# Altium footprint library UP-ROBOT Connectors(2013-02-26).PcbLib: 121 footprints (part 7 of 8)
Each footprint in its own frame and in the unit in brackets; x right, y up, seen from the top. Pads: shape width x height; smd on the part's side, far side on the other; paste and mask are expansions set on the pad; w line width, h text height; cw(c..) or ccw(c..) is an arc to the next point about the centre after c.
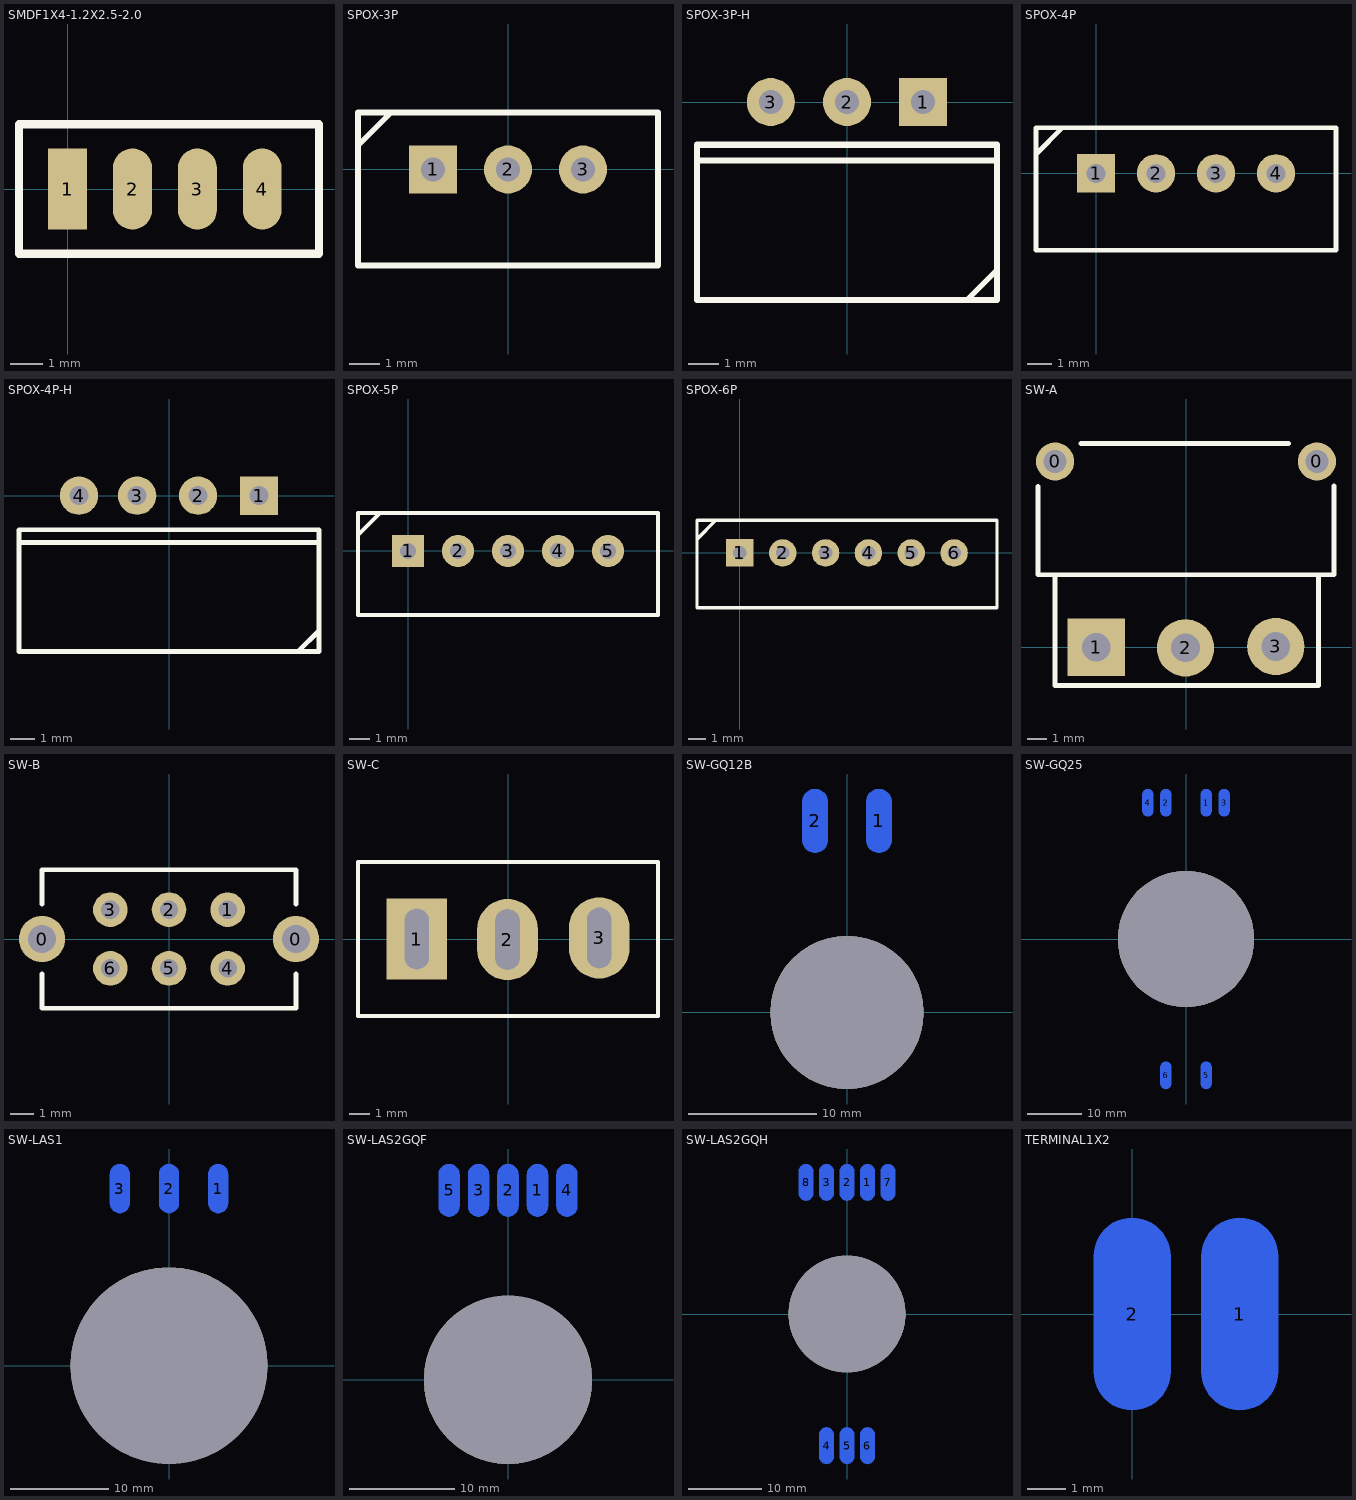
[diagram p6: the footprints below, top view; thin cyan lines are the x and y axes]

## SMDF1X4-1.2X2.5-2.0 [mm]
pads (4):
  rect 1.2x2.5 smd: 1(0,0)
  oval 1.2x2.5 smd: 2(2,0) 3(4,0) 4(6,0)
Top Overlay:
  lines w0.254: -1.5,-2 7.75,-2 7.75,2 -1.5,2 -1.5,0 -1.5,-2

## SPOX-3P [mm]
pads (3):
  rect 1.6x1.6 hole 0.8: 1(-2.5,0)
  round 1.6 hole 0.8: 2(0,0) 3(2.5,0)
Top Overlay:
  lines w0.203: -5,0.8 -3.9,1.9 ; -3.9,1.9 -3.9,1.9 ; -5,-3.2 5,-3.2 5,1.9 -5,1.9 -5,-3.2
3D body: height 5.9, standoff -3.5, extent -4.9,-3.1 5,1.8

## SPOX-3P-H [mm]
pads (3):
  rect 1.6x1.6 hole 0.8: 1(2.54,0)
  round 1.6 hole 0.8: 2(0,0) 3(-2.54,0)
Top Overlay:
  lines w0.203: -5,-1.95 5,-1.95 ; 4,-6.6 5,-5.6 ; -5,-6.6 -5,-1.425 5,-1.425 5,-6.6 -5,-6.6
3D body: height 4.9, standoff -3.5, extent -4.95,-6.65 4.95,1.25

## SPOX-4P [mm]
pads (4):
  rect 1.6x1.6 hole 0.8: 1(0,0)
  round 1.6 hole 0.8: 2(2.5,0) 3(5,0) 4(7.5,0)
Top Overlay:
  lines w0.203: -2.5,0.8 -1.4,1.9 ; -1.4,1.9 -1.4,1.9 ; -2.5,-3.2 10,-3.2 10,1.9 -2.5,1.9 -2.5,-3.2
3D body: height 5.49, standoff -3.91, extent -2.45,-3 9.95,1.9

## SPOX-4P-H [mm]
pads (4):
  rect 1.6x1.6 hole 0.8: 1(3.75,0)
  round 1.6 hole 0.8: 2(1.21,0) 3(-1.33,0) 4(-3.75,0)
Top Overlay:
  lines w0.203: -6.25,-1.95 6.25,-1.95 ; 5.388,-6.488 6.25,-5.625 ; 6.25,-1.5 6.25,-6.5 -6.25,-6.5 -6.25,-1.425 6.25,-1.425
3D body: height 4.9, standoff -3.5, extent -6.15,-6.575 6.25,1.325

## SPOX-5P [mm]
pads (5):
  rect 1.6x1.6 hole 0.8: 1(0,0)
  round 1.6 hole 0.8: 2(2.5,0) 3(5,0) 4(7.5,0) 5(10,0)
Top Overlay:
  lines w0.203: -2.5,0.8 -1.4,1.9 ; -1.4,1.9 -1.4,1.9 ; -2.5,-3.2 -2.5,1.9 12.5,1.9 12.5,-3.2 -2.5,-3.2
3D body: height 5.9, standoff -3.5, extent -2.475,-3.1 12.425,1.8

## SPOX-6P [mm]
pads (6):
  rect 1.6x1.6 hole 0.8: 1(0,0)
  round 1.6 hole 0.8: 2(2.5,0) 3(5,0) 4(7.5,0) 5(10,0) 6(12.5,0)
Top Overlay:
  lines w0.203: -2.5,0.8 -1.4,1.9 ; -1.4,1.9 -1.4,1.9 ; -2.5,-3.2 -2.5,1.9 15,1.9 15,-3.2 -2.5,-3.2

## SW-A [mm]
pads (5):
  round 2 hole 1.2: 0(-6.85,9.73) 0(6.85,9.73)
  rect 3x3 hole 1.5: 1(-4.7,0)
  round 3 hole 1.5: 2(-0.025,-0.025) 3(4.7,0.05)
Top Overlay:
  lines w0.254: -7.75,8.425 -7.75,3.8 7.75,3.8 7.75,8.45 ; -6.85,3.75 -6.85,-2 6.925,-2 6.925,3.75 ; -5.5,10.675 5.375,10.675
3D body: height 7.1, standoff -1.94, extent -6.9,-0.5 7,17.5

## SW-B [mm]
pads (8):
  round 2 hole 1.2: 0(-5.5,0) 0(5.5,0)
  round 1.5 hole 0.8: 1(2.54,1.27) 2(0,1.27) 3(-2.54,1.27) 4(2.54,-1.27) 5(0,-1.27) 6(-2.54,-1.27)
Top Overlay:
  lines w0.203: -5.5,-1.5 -5.5,-3 5.5,-3 5.5,-1.5 ; -5.5,1.5 -5.5,3 5.5,3 5.5,1.5

## SW-C [mm]
pads (3):
  rect 3x4 hole 1.2 slot 3 at 90 deg: 1(-4.5,0)
  oval 3x4 hole 1.2 slot 3 at 90 deg: 2(-0.025,-0.025) 3(4.5,0.05)
Top Overlay:
  lines w0.203: -0.05,-3.8 -7.4,-3.8 -7.4,3.8 -0.05,3.8 ; 0,-3.8 7.4,-3.8 7.4,3.8 0,3.8
3D body: height 11.78, standoff -3.4, extent -7.3,-3.8 7.3,3.8

## SW-GQ12B [mm]
pads (3):
  oval 2x5 smd far side: 1(2.5,15) 2(-2.5,15)
  round 12 hole 12: ""(0,0)
3D body: height 7, standoff -13.4, extent -8.75,-8.713 8.675,8.787

## SW-GQ25 [mm]
pads (7):
  oval 2x5 smd far side: 1(3.7,25) 2(-3.7,25) 3(7,25) 4(-7,25) 5(3.7,-25) 6(-3.7,-25)
  round 25 hole 25: ""(0,0)
3D body: height 2, standoff -39.5, extent -14,-16.15 13.9,15.85

## SW-LAS1 [mm]
pads (4):
  oval 2x5 smd far side: 1(5,18) 2(0,18) 3(-5,18)
  round 20 hole 20: ""(0,0)
3D body: height 2, standoff -36.7, extent -12.6,-10.912 12.6,10.912

## SW-LAS2GQF [mm]
pads (6):
  oval 2x5 smd far side: 1(2.8,18) 2(0,18) 3(-2.8,18) 4(5.6,18) 5(-5.6,18)
  round 16 hole 16: ""(0,0)
3D body: height 1.6, standoff -35.5, extent -10.9,-9.44 10.9,9.44

## SW-LAS2GQH [mm]
pads (9):
  oval 2x5 smd far side: 1(2.8,18) 2(0,18) 3(-2.8,18) 4(-2.8,-18) 5(0,-18) 6(2.8,-18) 7(5.6,18) 8(-5.6,18)
  round 16 hole 16: ""(0,0)
3D body: height 3, standoff -35.5, extent -10.9,-9.44 10.9,9.44

## TERMINAL1X2 [mm]
pads (2):
  oval 2x5 smd far side: 1(2.8,0) 2(0,0)